# Altium schematic symbol library jlcpcb_2025_04_capacitors_extended_0603.schlib: 3668 symbols (part 20 of 20) (continued)
## TMK107BBJ106MA-T
designator C?  Capacitance: 10uF  (hidden comment: *)
Capacitor, Ceramic (MLCC), 10uF, ±20%, 25V, X5R, ±20%, SMD 0603; Manufacturer: Taiyo Yuden; Manufacturer Part Number: TMK107BBJ106MA-T; Package Size: 0603; JLCPCB Basic Part: No; JLCPCB Part Number: C386081; Supplier 1: LCSC; Category: Capacitors - MLCC; Supplier Part Number 1: C386081; Tolerance: ±20%; Voltage Rating: 25V; Temperature Coefficient: X5R; RoHS: Yes; ComponentLink1Description: Datasheet; ComponentLink1URL: https://wmsc.lcsc.com/wmsc/upload/file/pdf/v2/lcsc/2304140030_Taiyo-Yuden-TMK107BBJ106MA-T_C386081.pdf; ComponentLink2Description: JLCPCB Part URL; ComponentLink2URL: https://jlcpcb.com/partdetail/C386081; ComponentLink3Description: LCSC Part URL; ComponentLink3URL: https://lcsc.com/product-detail/Multilayer-Ceramic-Capacitors-MLCC---SMD-SMT_Taiyo-Yuden-Taiyo-Yuden-TMK107BBJ106MA-T_C386081.html
footprint CAP-0603 (0603 (1608M) Capacitor)
pins: 1, 2

## TMK107BBJ225KAHT
designator C?  Capacitance: 2.2uF  (hidden comment: *)
Capacitor, Ceramic (MLCC), 2.2uF, ±10%, 25V, X5R, ±10%, SMD 0603; Manufacturer: Taiyo Yuden; Manufacturer Part Number: TMK107BBJ225KAHT; Package Size: 0603; JLCPCB Basic Part: No; JLCPCB Part Number: C650980; Supplier 1: LCSC; Category: Capacitors - MLCC; Supplier Part Number 1: C650980; Tolerance: ±10%; Voltage Rating: 25V; Temperature Coefficient: X5R; RoHS: Yes; ComponentLink1Description: Datasheet; ComponentLink1URL: https://wmsc.lcsc.com/wmsc/upload/file/pdf/v2/lcsc/2211282200_Taiyo-Yuden-TMK107BBJ225KAHT_C650980.pdf; ComponentLink2Description: JLCPCB Part URL; ComponentLink2URL: https://jlcpcb.com/partdetail/C650980; ComponentLink3Description: LCSC Part URL; ComponentLink3URL: https://lcsc.com/product-detail/Multilayer-Ceramic-Capacitors-MLCC---SMD-SMT_Taiyo-Yuden-Taiyo-Yuden-TMK107BBJ225KAHT_C650980.html
footprint CAP-0603 (0603 (1608M) Capacitor)
pins: 1, 2

## TMK107BBJ475KA-T
designator C?  Capacitance: 4.7uF  (hidden comment: *)
Capacitor, Ceramic (MLCC), 4.7uF, ±10%, 25V, X5R, ±10%, SMD 0603; Manufacturer: Taiyo Yuden; Manufacturer Part Number: TMK107BBJ475KA-T; Package Size: 0603; JLCPCB Basic Part: No; JLCPCB Part Number: C268021; Supplier 1: LCSC; Category: Capacitors - MLCC; Supplier Part Number 1: C268021; Tolerance: ±10%; Voltage Rating: 25V; Temperature Coefficient: X5R; RoHS: Yes; ComponentLink1Description: Datasheet; ComponentLink1URL: https://wmsc.lcsc.com/wmsc/upload/file/pdf/v2/lcsc/2304140030_Taiyo-Yuden-TMK107BBJ475KA-T_C268021.pdf; ComponentLink2Description: JLCPCB Part URL; ComponentLink2URL: https://jlcpcb.com/partdetail/C268021; ComponentLink3Description: LCSC Part URL; ComponentLink3URL: https://lcsc.com/product-detail/Multilayer-Ceramic-Capacitors-MLCC---SMD-SMT_Taiyo-Yuden-Taiyo-Yuden-TMK107BBJ475KA-T_C268021.html
footprint CAP-0603 (0603 (1608M) Capacitor)
pins: 1, 2

## TMK107BJ105KA-T
designator C?  Capacitance: 1uF  (hidden comment: *)
Capacitor, Ceramic (MLCC), 1uF, ±10%, 25V, X5R, ±10%, SMD 0603; Manufacturer: Taiyo Yuden; Manufacturer Part Number: TMK107BJ105KA-T; Package Size: 0603; JLCPCB Basic Part: No; JLCPCB Part Number: C92828; Supplier 1: LCSC; Category: Capacitors - MLCC; Supplier Part Number 1: C92828; Tolerance: ±10%; Voltage Rating: 25V; Temperature Coefficient: X5R; RoHS: Yes; ComponentLink1Description: Datasheet; ComponentLink1URL: https://wmsc.lcsc.com/wmsc/upload/file/pdf/v2/lcsc/2211282300_Taiyo-Yuden-TMK107BJ105KA-T_C92828.pdf; ComponentLink2Description: JLCPCB Part URL; ComponentLink2URL: https://jlcpcb.com/partdetail/C92828; ComponentLink3Description: LCSC Part URL; ComponentLink3URL: https://lcsc.com/product-detail/Multilayer-Ceramic-Capacitors-MLCC---SMD-SMT_Taiyo-Yuden-Taiyo-Yuden-TMK107BJ105KA-T_C92828.html
footprint CAP-0603 (0603 (1608M) Capacitor)
pins: 1, 2

## TMK107BJ105KAHT
designator C?  Capacitance: 1uF  (hidden comment: *)
Capacitor, Ceramic (MLCC), 1uF, ±10%, 25V, X5R, ±10%, SMD 0603; Manufacturer: Taiyo Yuden; Manufacturer Part Number: TMK107BJ105KAHT; Package Size: 0603; JLCPCB Basic Part: No; JLCPCB Part Number: C650963; Supplier 1: LCSC; Category: Capacitors - MLCC; Supplier Part Number 1: C650963; Tolerance: ±10%; Voltage Rating: 25V; Temperature Coefficient: X5R; RoHS: Yes; ComponentLink1Description: Datasheet; ComponentLink1URL: https://wmsc.lcsc.com/wmsc/upload/file/pdf/v2/lcsc/2304140030_Taiyo-Yuden-TMK107BJ105KAHT_C650963.pdf; ComponentLink2Description: JLCPCB Part URL; ComponentLink2URL: https://jlcpcb.com/partdetail/C650963; ComponentLink3Description: LCSC Part URL; ComponentLink3URL: https://lcsc.com/product-detail/Multilayer-Ceramic-Capacitors-MLCC---SMD-SMT_Taiyo-Yuden-Taiyo-Yuden-TMK107BJ105KAHT_C650963.html
footprint CAP-0603 (0603 (1608M) Capacitor)
pins: 1, 2

## TMK107BJ105MA-T
designator C?  Capacitance: 1uF  (hidden comment: *)
Capacitor, Ceramic (MLCC), 1uF, ±20%, 25V, X5R, ±20%, SMD 0603; Manufacturer: Taiyo Yuden; Manufacturer Part Number: TMK107BJ105MA-T; Package Size: 0603; JLCPCB Basic Part: No; JLCPCB Part Number: C2180229; Supplier 1: LCSC; Category: Capacitors - MLCC; Supplier Part Number 1: C2180229; Tolerance: ±20%; Voltage Rating: 25V; Temperature Coefficient: X5R; RoHS: Yes; ComponentLink1Description: Datasheet; ComponentLink1URL: https://wmsc.lcsc.com/wmsc/upload/file/pdf/v2/lcsc/2211282000_Taiyo-Yuden-TMK107BJ105MA-T_C2180229.pdf; ComponentLink2Description: JLCPCB Part URL; ComponentLink2URL: https://jlcpcb.com/partdetail/C2180229; ComponentLink3Description: LCSC Part URL; ComponentLink3URL: https://lcsc.com/product-detail/Multilayer-Ceramic-Capacitors-MLCC---SMD-SMT_Taiyo-Yuden-Taiyo-Yuden-TMK107BJ105MA-T_C2180229.html
footprint CAP-0603 (0603 (1608M) Capacitor)
pins: 1, 2

## UMF107B7104KAHT
designator C?  Capacitance: 100nF  (hidden comment: *)
Capacitor, Ceramic (MLCC), 100nF, ±10%, 50V, X7R, ±10%, SMD 0603; Manufacturer: Taiyo Yuden; Manufacturer Part Number: UMF107B7104KAHT; Package Size: 0603; JLCPCB Basic Part: No; JLCPCB Part Number: C386106; Supplier 1: LCSC; Category: Capacitors - MLCC; Supplier Part Number 1: C386106; Tolerance: ±10%; Voltage Rating: 50V; Temperature Coefficient: X7R; RoHS: Yes; ComponentLink1Description: Datasheet; ComponentLink1URL: https://wmsc.lcsc.com/wmsc/upload/file/pdf/v2/lcsc/1912111437_Taiyo-Yuden-UMF107B7104KAHT_C386106.pdf; ComponentLink2Description: JLCPCB Part URL; ComponentLink2URL: https://jlcpcb.com/partdetail/C386106; ComponentLink3Description: LCSC Part URL; ComponentLink3URL: https://lcsc.com/product-detail/Multilayer-Ceramic-Capacitors-MLCC---SMD-SMT_Taiyo-Yuden-Taiyo-Yuden-UMF107B7104KAHT_C386106.html
footprint CAP-0603 (0603 (1608M) Capacitor)
pins: 1, 2

## UMJ107BB7103KAHT
designator C?  Capacitance: 10nF  (hidden comment: *)
Capacitor, Ceramic (MLCC), 10nF, ±10%, 50V, X7R, ±10%, SMD 0603; Manufacturer: Taiyo Yuden; Manufacturer Part Number: UMJ107BB7103KAHT; Package Size: 0603; JLCPCB Basic Part: No; JLCPCB Part Number: C651013; Supplier 1: LCSC; Category: Capacitors - MLCC; Supplier Part Number 1: C651013; Tolerance: ±10%; Voltage Rating: 50V; Temperature Coefficient: X7R; RoHS: Yes; ComponentLink1Description: Datasheet; ComponentLink1URL: https://wmsc.lcsc.com/wmsc/upload/file/pdf/v2/lcsc/2304140030_Taiyo-Yuden-UMJ107BB7103KAHT_C651013.pdf; ComponentLink2Description: JLCPCB Part URL; ComponentLink2URL: https://jlcpcb.com/partdetail/C651013; ComponentLink3Description: LCSC Part URL; ComponentLink3URL: https://lcsc.com/product-detail/Multilayer-Ceramic-Capacitors-MLCC---SMD-SMT_Taiyo-Yuden-Taiyo-Yuden-UMJ107BB7103KAHT_C651013.html
footprint CAP-0603 (0603 (1608M) Capacitor)
pins: 1, 2

## UMJ107BB7104KAHT
designator C?  Capacitance: 100nF  (hidden comment: *)
Capacitor, Ceramic (MLCC), 100nF, ±10%, 50V, X7R, ±10%, SMD 0603; Manufacturer: Taiyo Yuden; Manufacturer Part Number: UMJ107BB7104KAHT; Package Size: 0603; JLCPCB Basic Part: No; JLCPCB Part Number: C651002; Supplier 1: LCSC; Category: Capacitors - MLCC; Supplier Part Number 1: C651002; Tolerance: ±10%; Voltage Rating: 50V; Temperature Coefficient: X7R; RoHS: Yes; ComponentLink1Description: Datasheet; ComponentLink1URL: https://wmsc.lcsc.com/wmsc/upload/file/pdf/v2/lcsc/2304140030_Taiyo-Yuden-UMJ107BB7104KAHT_C651002.pdf; ComponentLink2Description: JLCPCB Part URL; ComponentLink2URL: https://jlcpcb.com/partdetail/C651002; ComponentLink3Description: LCSC Part URL; ComponentLink3URL: https://lcsc.com/product-detail/Multilayer-Ceramic-Capacitors-MLCC---SMD-SMT_Taiyo-Yuden-Taiyo-Yuden-UMJ107BB7104KAHT_C651002.html
footprint CAP-0603 (0603 (1608M) Capacitor)
pins: 1, 2

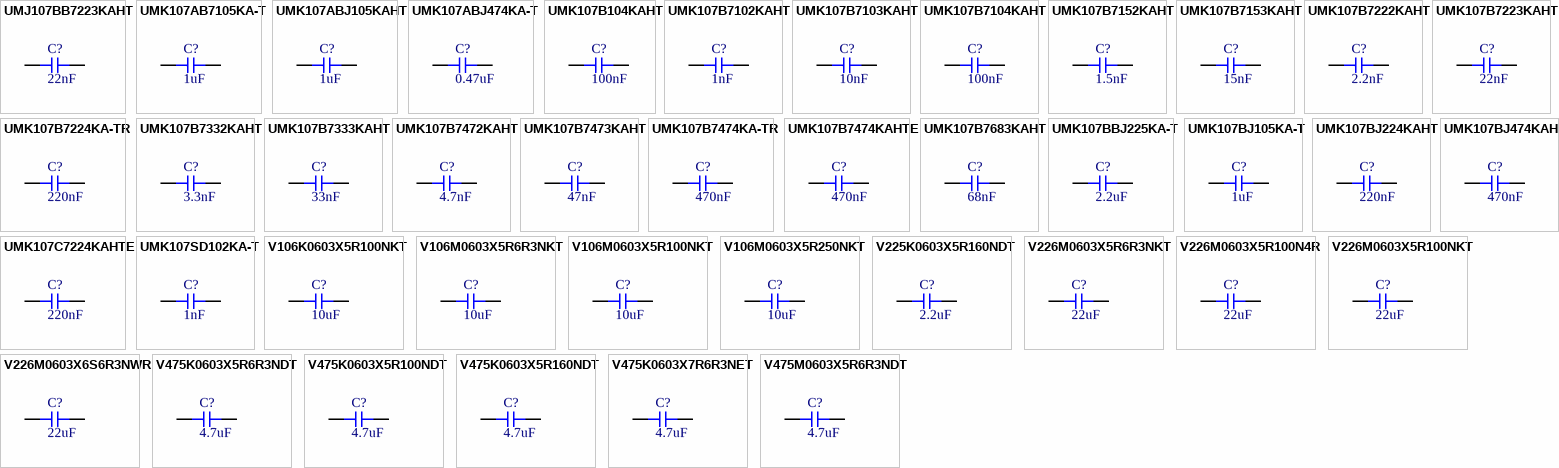
[diagram p90: symbols UMJ107BB7223KAHT to V475M0603X5R6R3NDT]

## UMJ107BB7223KAHT
designator C?  Capacitance: 22nF  (hidden comment: *)
Capacitor, Ceramic (MLCC), 22nF, ±10%, 50V, X7R, ±10%, SMD 0603; Manufacturer: Taiyo Yuden; Manufacturer Part Number: UMJ107BB7223KAHT; Package Size: 0603; JLCPCB Basic Part: No; JLCPCB Part Number: C412616; Supplier 1: LCSC; Category: Capacitors - MLCC; Supplier Part Number 1: C412616; Tolerance: ±10%; Voltage Rating: 50V; Temperature Coefficient: X7R; RoHS: Yes; ComponentLink1Description: Datasheet; ComponentLink1URL: https://wmsc.lcsc.com/wmsc/upload/file/pdf/v2/lcsc/2304140030_Taiyo-Yuden-UMJ107BB7223KAHT_C412616.pdf; ComponentLink2Description: JLCPCB Part URL; ComponentLink2URL: https://jlcpcb.com/partdetail/C412616; ComponentLink3Description: LCSC Part URL; ComponentLink3URL: https://lcsc.com/product-detail/Multilayer-Ceramic-Capacitors-MLCC---SMD-SMT_Taiyo-Yuden-Taiyo-Yuden-UMJ107BB7223KAHT_C412616.html
footprint CAP-0603 (0603 (1608M) Capacitor)
pins: 1, 2

## UMK107AB7105KA-T
designator C?  Capacitance: 1uF  (hidden comment: *)
Capacitor, Ceramic (MLCC), 1uF, ±10%, 50V, X7R, ±10%, SMD 0603; Manufacturer: Taiyo Yuden; Manufacturer Part Number: UMK107AB7105KA-T; Package Size: 0603; JLCPCB Basic Part: No; JLCPCB Part Number: C105174; Supplier 1: LCSC; Category: Capacitors - MLCC; Supplier Part Number 1: C105174; Tolerance: ±10%; Voltage Rating: 50V; Temperature Coefficient: X7R; RoHS: Yes; ComponentLink1Description: Datasheet; ComponentLink1URL: https://wmsc.lcsc.com/wmsc/upload/file/pdf/v2/lcsc/2211282300_Taiyo-Yuden-UMK107AB7105KA-T_C105174.pdf; ComponentLink2Description: JLCPCB Part URL; ComponentLink2URL: https://jlcpcb.com/partdetail/C105174; ComponentLink3Description: LCSC Part URL; ComponentLink3URL: https://lcsc.com/product-detail/Multilayer-Ceramic-Capacitors-MLCC---SMD-SMT_Taiyo-Yuden-Taiyo-Yuden-UMK107AB7105KA-T_C105174.html
footprint CAP-0603 (0603 (1608M) Capacitor)
pins: 1, 2

## UMK107ABJ105KAHT
designator C?  Capacitance: 1uF  (hidden comment: *)
Capacitor, Ceramic (MLCC), 1uF, ±10%, 50V, X5R, ±10%, SMD 0603; Manufacturer: Taiyo Yuden; Manufacturer Part Number: UMK107ABJ105KAHT; Package Size: 0603; JLCPCB Basic Part: No; JLCPCB Part Number: C386149; Supplier 1: LCSC; Category: Capacitors - MLCC; Supplier Part Number 1: C386149; Tolerance: ±10%; Voltage Rating: 50V; Temperature Coefficient: X5R; RoHS: Yes; ComponentLink1Description: Datasheet; ComponentLink1URL: https://wmsc.lcsc.com/wmsc/upload/file/pdf/v2/lcsc/2211282230_Taiyo-Yuden-UMK107ABJ105KAHT_C386149.pdf; ComponentLink2Description: JLCPCB Part URL; ComponentLink2URL: https://jlcpcb.com/partdetail/C386149; ComponentLink3Description: LCSC Part URL; ComponentLink3URL: https://lcsc.com/product-detail/Multilayer-Ceramic-Capacitors-MLCC---SMD-SMT_Taiyo-Yuden-Taiyo-Yuden-UMK107ABJ105KAHT_C386149.html
footprint CAP-0603 (0603 (1608M) Capacitor)
pins: 1, 2

## UMK107ABJ474KA-T
designator C?  Capacitance: 0.47uF  (hidden comment: *)
Capacitor, Ceramic (MLCC), 0.47uF, ±10%, 50V, X5R, ±10%, SMD 0603; Manufacturer: Taiyo Yuden; Manufacturer Part Number: UMK107ABJ474KA-T; Package Size: 0603; JLCPCB Basic Part: No; JLCPCB Part Number: C386150; Supplier 1: LCSC; Category: Capacitors - MLCC; Supplier Part Number 1: C386150; Tolerance: ±10%; Voltage Rating: 50V; Temperature Coefficient: X5R; RoHS: Yes; ComponentLink1Description: Datasheet; ComponentLink1URL: https://wmsc.lcsc.com/wmsc/upload/file/pdf/v2/lcsc/2211282230_Taiyo-Yuden-UMK107ABJ474KA-T_C386150.pdf; ComponentLink2Description: JLCPCB Part URL; ComponentLink2URL: https://jlcpcb.com/partdetail/C386150; ComponentLink3Description: LCSC Part URL; ComponentLink3URL: https://lcsc.com/product-detail/Multilayer-Ceramic-Capacitors-MLCC---SMD-SMT_Taiyo-Yuden-Taiyo-Yuden-UMK107ABJ474KA-T_C386150.html
footprint CAP-0603 (0603 (1608M) Capacitor)
pins: 1, 2

## UMK107B104KAHT
designator C?  Capacitance: 100nF  (hidden comment: *)
Capacitor, Ceramic (MLCC), 100nF, ±10%, 50V, X5R, ±10%, SMD 0603; Manufacturer: Taiyo Yuden; Manufacturer Part Number: UMK107B104KAHT; Package Size: 0603; JLCPCB Basic Part: No; JLCPCB Part Number: C386152; Supplier 1: LCSC; Category: Capacitors - MLCC; Supplier Part Number 1: C386152; Tolerance: ±10%; Voltage Rating: 50V; Temperature Coefficient: X5R; RoHS: Yes; ComponentLink1Description: Datasheet; ComponentLink1URL: https://wmsc.lcsc.com/wmsc/upload/file/pdf/v2/lcsc/2304140030_Taiyo-Yuden-UMK107B104KAHT_C386152.pdf; ComponentLink2Description: JLCPCB Part URL; ComponentLink2URL: https://jlcpcb.com/partdetail/C386152; ComponentLink3Description: LCSC Part URL; ComponentLink3URL: https://lcsc.com/product-detail/Multilayer-Ceramic-Capacitors-MLCC---SMD-SMT_Taiyo-Yuden-Taiyo-Yuden-UMK107B104KAHT_C386152.html
footprint CAP-0603 (0603 (1608M) Capacitor)
pins: 1, 2

## UMK107B7102KAHT
designator C?  Capacitance: 1nF  (hidden comment: *)
Capacitor, Ceramic (MLCC), 1nF, ±10%, 50V, X7R, ±10%, SMD 0603; Manufacturer: Taiyo Yuden; Manufacturer Part Number: UMK107B7102KAHT; Package Size: 0603; JLCPCB Basic Part: No; JLCPCB Part Number: C650959; Supplier 1: LCSC; Category: Capacitors - MLCC; Supplier Part Number 1: C650959; Tolerance: ±10%; Voltage Rating: 50V; Temperature Coefficient: X7R; RoHS: Yes; ComponentLink1Description: Datasheet; ComponentLink1URL: https://wmsc.lcsc.com/wmsc/upload/file/pdf/v2/lcsc/2304140030_Taiyo-Yuden-UMK107B7102KAHT_C650959.pdf; ComponentLink2Description: JLCPCB Part URL; ComponentLink2URL: https://jlcpcb.com/partdetail/C650959; ComponentLink3Description: LCSC Part URL; ComponentLink3URL: https://lcsc.com/product-detail/Multilayer-Ceramic-Capacitors-MLCC---SMD-SMT_Taiyo-Yuden-Taiyo-Yuden-UMK107B7102KAHT_C650959.html
footprint CAP-0603 (0603 (1608M) Capacitor)
pins: 1, 2

## UMK107B7103KAHT
designator C?  Capacitance: 10nF  (hidden comment: *)
Capacitor, Ceramic (MLCC), 10nF, ±10%, 50V, X7R, ±10%, SMD 0603; Manufacturer: Taiyo Yuden; Manufacturer Part Number: UMK107B7103KAHT; Package Size: 0603; JLCPCB Basic Part: No; JLCPCB Part Number: C386154; Supplier 1: LCSC; Category: Capacitors - MLCC; Supplier Part Number 1: C386154; Tolerance: ±10%; Voltage Rating: 50V; Temperature Coefficient: X7R; RoHS: Yes; ComponentLink1Description: Datasheet; ComponentLink1URL: https://wmsc.lcsc.com/wmsc/upload/file/pdf/v2/lcsc/2304140030_Taiyo-Yuden-UMK107B7103KAHT_C386154.pdf; ComponentLink2Description: JLCPCB Part URL; ComponentLink2URL: https://jlcpcb.com/partdetail/C386154; ComponentLink3Description: LCSC Part URL; ComponentLink3URL: https://lcsc.com/product-detail/Multilayer-Ceramic-Capacitors-MLCC---SMD-SMT_Taiyo-Yuden-Taiyo-Yuden-UMK107B7103KAHT_C386154.html
footprint CAP-0603 (0603 (1608M) Capacitor)
pins: 1, 2

## UMK107B7104KAHT
designator C?  Capacitance: 100nF  (hidden comment: *)
Capacitor, Ceramic (MLCC), 100nF, ±10%, 50V, X7R, ±10%, SMD 0603; Manufacturer: Taiyo Yuden; Manufacturer Part Number: UMK107B7104KAHT; Package Size: 0603; JLCPCB Basic Part: No; JLCPCB Part Number: C386155; Supplier 1: LCSC; Category: Capacitors - MLCC; Supplier Part Number 1: C386155; Tolerance: ±10%; Voltage Rating: 50V; Temperature Coefficient: X7R; RoHS: Yes; ComponentLink1Description: Datasheet; ComponentLink1URL: https://wmsc.lcsc.com/wmsc/upload/file/pdf/v2/lcsc/1912111437_Taiyo-Yuden-UMK107B7104KAHT_C386155.pdf; ComponentLink2Description: JLCPCB Part URL; ComponentLink2URL: https://jlcpcb.com/partdetail/C386155; ComponentLink3Description: LCSC Part URL; ComponentLink3URL: https://lcsc.com/product-detail/Multilayer-Ceramic-Capacitors-MLCC---SMD-SMT_Taiyo-Yuden-Taiyo-Yuden-UMK107B7104KAHT_C386155.html
footprint CAP-0603 (0603 (1608M) Capacitor)
pins: 1, 2

## UMK107B7152KAHT
designator C?  Capacitance: 1.5nF  (hidden comment: *)
Capacitor, Ceramic (MLCC), 1.5nF, ±10%, 50V, X7R, ±10%, SMD 0603; Manufacturer: Taiyo Yuden; Manufacturer Part Number: UMK107B7152KAHT; Package Size: 0603; JLCPCB Basic Part: No; JLCPCB Part Number: C841048; Supplier 1: LCSC; Category: Capacitors - MLCC; Supplier Part Number 1: C841048; Tolerance: ±10%; Voltage Rating: 50V; Temperature Coefficient: X7R; RoHS: Yes; ComponentLink1Description: Datasheet; ComponentLink1URL: https://wmsc.lcsc.com/wmsc/upload/file/pdf/v2/lcsc/2211282200_Taiyo-Yuden-UMK107B7152KAHT_C841048.pdf; ComponentLink2Description: JLCPCB Part URL; ComponentLink2URL: https://jlcpcb.com/partdetail/C841048; ComponentLink3Description: LCSC Part URL; ComponentLink3URL: https://lcsc.com/product-detail/Multilayer-Ceramic-Capacitors-MLCC---SMD-SMT_Taiyo-Yuden-Taiyo-Yuden-UMK107B7152KAHT_C841048.html
footprint CAP-0603 (0603 (1608M) Capacitor)
pins: 1, 2

## UMK107B7153KAHT
designator C?  Capacitance: 15nF  (hidden comment: *)
Capacitor, Ceramic (MLCC), 15nF, ±10%, 50V, X7R, ±10%, SMD 0603; Manufacturer: Taiyo Yuden; Manufacturer Part Number: UMK107B7153KAHT; Package Size: 0603; JLCPCB Basic Part: No; JLCPCB Part Number: C386156; Supplier 1: LCSC; Category: Capacitors - MLCC; Supplier Part Number 1: C386156; Tolerance: ±10%; Voltage Rating: 50V; Temperature Coefficient: X7R; RoHS: Yes; ComponentLink1Description: Datasheet; ComponentLink1URL: https://wmsc.lcsc.com/wmsc/upload/file/pdf/v2/lcsc/2304140030_Taiyo-Yuden-UMK107B7153KAHT_C386156.pdf; ComponentLink2Description: JLCPCB Part URL; ComponentLink2URL: https://jlcpcb.com/partdetail/C386156; ComponentLink3Description: LCSC Part URL; ComponentLink3URL: https://lcsc.com/product-detail/Multilayer-Ceramic-Capacitors-MLCC---SMD-SMT_Taiyo-Yuden-Taiyo-Yuden-UMK107B7153KAHT_C386156.html
footprint CAP-0603 (0603 (1608M) Capacitor)
pins: 1, 2

## UMK107B7222KAHT
designator C?  Capacitance: 2.2nF  (hidden comment: *)
Capacitor, Ceramic (MLCC), 2.2nF, ±10%, 50V, X7R, ±10%, SMD 0603; Manufacturer: Taiyo Yuden; Manufacturer Part Number: UMK107B7222KAHT; Package Size: 0603; JLCPCB Basic Part: No; JLCPCB Part Number: C650979; Supplier 1: LCSC; Category: Capacitors - MLCC; Supplier Part Number 1: C650979; Tolerance: ±10%; Voltage Rating: 50V; Temperature Coefficient: X7R; RoHS: Yes; ComponentLink1Description: Datasheet; ComponentLink1URL: https://wmsc.lcsc.com/wmsc/upload/file/pdf/v2/lcsc/2304140030_Taiyo-Yuden-UMK107B7222KAHT_C650979.pdf; ComponentLink2Description: JLCPCB Part URL; ComponentLink2URL: https://jlcpcb.com/partdetail/C650979; ComponentLink3Description: LCSC Part URL; ComponentLink3URL: https://lcsc.com/product-detail/Multilayer-Ceramic-Capacitors-MLCC---SMD-SMT_Taiyo-Yuden-Taiyo-Yuden-UMK107B7222KAHT_C650979.html
footprint CAP-0603 (0603 (1608M) Capacitor)
pins: 1, 2

## UMK107B7223KAHT
designator C?  Capacitance: 22nF  (hidden comment: *)
Capacitor, Ceramic (MLCC), 22nF, ±10%, 50V, X7R, ±10%, SMD 0603; Manufacturer: Taiyo Yuden; Manufacturer Part Number: UMK107B7223KAHT; Package Size: 0603; JLCPCB Basic Part: No; JLCPCB Part Number: C650951; Supplier 1: LCSC; Category: Capacitors - MLCC; Supplier Part Number 1: C650951; Tolerance: ±10%; Voltage Rating: 50V; Temperature Coefficient: X7R; RoHS: Yes; ComponentLink1Description: Datasheet; ComponentLink1URL: https://wmsc.lcsc.com/wmsc/upload/file/pdf/v2/lcsc/2304140030_Taiyo-Yuden-UMK107B7223KAHT_C650951.pdf; ComponentLink2Description: JLCPCB Part URL; ComponentLink2URL: https://jlcpcb.com/partdetail/C650951; ComponentLink3Description: LCSC Part URL; ComponentLink3URL: https://lcsc.com/product-detail/Multilayer-Ceramic-Capacitors-MLCC---SMD-SMT_Taiyo-Yuden-Taiyo-Yuden-UMK107B7223KAHT_C650951.html
footprint CAP-0603 (0603 (1608M) Capacitor)
pins: 1, 2

## UMK107B7224KA-TR
designator C?  Capacitance: 220nF  (hidden comment: *)
Capacitor, Ceramic (MLCC), 220nF, ±10%, 50V, X7R, ±10%, SMD 0603; Manufacturer: Taiyo Yuden; Manufacturer Part Number: UMK107B7224KA-TR; Package Size: 0603; JLCPCB Basic Part: No; JLCPCB Part Number: C524964; Supplier 1: LCSC; Category: Capacitors - MLCC; Supplier Part Number 1: C524964; Tolerance: ±10%; Voltage Rating: 50V; Temperature Coefficient: X7R; RoHS: Yes; ComponentLink1Description: Datasheet; ComponentLink1URL: https://wmsc.lcsc.com/wmsc/upload/file/pdf/v2/lcsc/2211282200_Taiyo-Yuden-UMK107B7224KA-TR_C524964.pdf; ComponentLink2Description: JLCPCB Part URL; ComponentLink2URL: https://jlcpcb.com/partdetail/C524964; ComponentLink3Description: LCSC Part URL; ComponentLink3URL: https://lcsc.com/product-detail/Multilayer-Ceramic-Capacitors-MLCC---SMD-SMT_Taiyo-Yuden-Taiyo-Yuden-UMK107B7224KA-TR_C524964.html
footprint CAP-0603 (0603 (1608M) Capacitor)
pins: 1, 2

## UMK107B7332KAHT
designator C?  Capacitance: 3.3nF  (hidden comment: *)
Capacitor, Ceramic (MLCC), 3.3nF, ±10%, 50V, X7R, ±10%, SMD 0603; Manufacturer: Taiyo Yuden; Manufacturer Part Number: UMK107B7332KAHT; Package Size: 0603; JLCPCB Basic Part: No; JLCPCB Part Number: C650966; Supplier 1: LCSC; Category: Capacitors - MLCC; Supplier Part Number 1: C650966; Tolerance: ±10%; Voltage Rating: 50V; Temperature Coefficient: X7R; RoHS: Yes; ComponentLink1Description: Datasheet; ComponentLink1URL: https://wmsc.lcsc.com/wmsc/upload/file/pdf/v2/lcsc/2304140030_Taiyo-Yuden-UMK107B7332KAHT_C650966.pdf; ComponentLink2Description: JLCPCB Part URL; ComponentLink2URL: https://jlcpcb.com/partdetail/C650966; ComponentLink3Description: LCSC Part URL; ComponentLink3URL: https://lcsc.com/product-detail/Multilayer-Ceramic-Capacitors-MLCC---SMD-SMT_Taiyo-Yuden-Taiyo-Yuden-UMK107B7332KAHT_C650966.html
footprint CAP-0603 (0603 (1608M) Capacitor)
pins: 1, 2

## UMK107B7333KAHT
designator C?  Capacitance: 33nF  (hidden comment: *)
Capacitor, Ceramic (MLCC), 33nF, ±10%, 50V, X7R, ±10%, SMD 0603; Manufacturer: Taiyo Yuden; Manufacturer Part Number: UMK107B7333KAHT; Package Size: 0603; JLCPCB Basic Part: No; JLCPCB Part Number: C650993; Supplier 1: LCSC; Category: Capacitors - MLCC; Supplier Part Number 1: C650993; Tolerance: ±10%; Voltage Rating: 50V; Temperature Coefficient: X7R; RoHS: Yes; ComponentLink1Description: Datasheet; ComponentLink1URL: https://wmsc.lcsc.com/wmsc/upload/file/pdf/v2/lcsc/2304140030_Taiyo-Yuden-UMK107B7333KAHT_C650993.pdf; ComponentLink2Description: JLCPCB Part URL; ComponentLink2URL: https://jlcpcb.com/partdetail/C650993; ComponentLink3Description: LCSC Part URL; ComponentLink3URL: https://lcsc.com/product-detail/Multilayer-Ceramic-Capacitors-MLCC---SMD-SMT_Taiyo-Yuden-Taiyo-Yuden-UMK107B7333KAHT_C650993.html
footprint CAP-0603 (0603 (1608M) Capacitor)
pins: 1, 2

## UMK107B7472KAHT
designator C?  Capacitance: 4.7nF  (hidden comment: *)
Capacitor, Ceramic (MLCC), 4.7nF, ±10%, 50V, X7R, ±10%, SMD 0603; Manufacturer: Taiyo Yuden; Manufacturer Part Number: UMK107B7472KAHT; Package Size: 0603; JLCPCB Basic Part: No; JLCPCB Part Number: C386157; Supplier 1: LCSC; Category: Capacitors - MLCC; Supplier Part Number 1: C386157; Tolerance: ±10%; Voltage Rating: 50V; Temperature Coefficient: X7R; RoHS: Yes; ComponentLink1Description: Datasheet; ComponentLink1URL: https://wmsc.lcsc.com/wmsc/upload/file/pdf/v2/lcsc/2304140030_Taiyo-Yuden-UMK107B7472KAHT_C386157.pdf; ComponentLink2Description: JLCPCB Part URL; ComponentLink2URL: https://jlcpcb.com/partdetail/C386157; ComponentLink3Description: LCSC Part URL; ComponentLink3URL: https://lcsc.com/product-detail/Multilayer-Ceramic-Capacitors-MLCC---SMD-SMT_Taiyo-Yuden-Taiyo-Yuden-UMK107B7472KAHT_C386157.html
footprint CAP-0603 (0603 (1608M) Capacitor)
pins: 1, 2

## UMK107B7473KAHT
designator C?  Capacitance: 47nF  (hidden comment: *)
Capacitor, Ceramic (MLCC), 47nF, ±10%, 50V, X7R, ±10%, SMD 0603; Manufacturer: Taiyo Yuden; Manufacturer Part Number: UMK107B7473KAHT; Package Size: 0603; JLCPCB Basic Part: No; JLCPCB Part Number: C386158; Supplier 1: LCSC; Category: Capacitors - MLCC; Supplier Part Number 1: C386158; Tolerance: ±10%; Voltage Rating: 50V; Temperature Coefficient: X7R; RoHS: Yes; ComponentLink1Description: Datasheet; ComponentLink1URL: https://wmsc.lcsc.com/wmsc/upload/file/pdf/v2/lcsc/2304140030_Taiyo-Yuden-UMK107B7473KAHT_C386158.pdf; ComponentLink2Description: JLCPCB Part URL; ComponentLink2URL: https://jlcpcb.com/partdetail/C386158; ComponentLink3Description: LCSC Part URL; ComponentLink3URL: https://lcsc.com/product-detail/Multilayer-Ceramic-Capacitors-MLCC---SMD-SMT_Taiyo-Yuden-Taiyo-Yuden-UMK107B7473KAHT_C386158.html
footprint CAP-0603 (0603 (1608M) Capacitor)
pins: 1, 2

## UMK107B7474KA-TR
designator C?  Capacitance: 470nF  (hidden comment: *)
Capacitor, Ceramic (MLCC), 470nF, ±10%, 50V, X7R, ±10%, SMD 0603; Manufacturer: Taiyo Yuden; Manufacturer Part Number: UMK107B7474KA-TR; Package Size: 0603; JLCPCB Basic Part: No; JLCPCB Part Number: C92847; Supplier 1: LCSC; Category: Capacitors - MLCC; Supplier Part Number 1: C92847; Tolerance: ±10%; Voltage Rating: 50V; Temperature Coefficient: X7R; RoHS: Yes; ComponentLink1Description: Datasheet; ComponentLink1URL: https://wmsc.lcsc.com/wmsc/upload/file/pdf/v2/lcsc/2211282300_Taiyo-Yuden-UMK107B7474KA-TR_C92847.pdf; ComponentLink2Description: JLCPCB Part URL; ComponentLink2URL: https://jlcpcb.com/partdetail/C92847; ComponentLink3Description: LCSC Part URL; ComponentLink3URL: https://lcsc.com/product-detail/Multilayer-Ceramic-Capacitors-MLCC---SMD-SMT_Taiyo-Yuden-Taiyo-Yuden-UMK107B7474KA-TR_C92847.html
footprint CAP-0603 (0603 (1608M) Capacitor)
pins: 1, 2

## UMK107B7474KAHTE
designator C?  Capacitance: 470nF  (hidden comment: *)
Capacitor, Ceramic (MLCC), 470nF, ±10%, 50V, X7R, ±10%, SMD 0603; Manufacturer: Taiyo Yuden; Manufacturer Part Number: UMK107B7474KAHTE; Package Size: 0603; JLCPCB Basic Part: No; JLCPCB Part Number: C2905413; Supplier 1: LCSC; Category: Capacitors - MLCC; Supplier Part Number 1: C2905413; Tolerance: ±10%; Voltage Rating: 50V; Temperature Coefficient: X7R; RoHS: Yes; ComponentLink1Description: Datasheet; ComponentLink1URL: https://wmsc.lcsc.com/wmsc/upload/file/pdf/v2/lcsc/2203231830_Taiyo-Yuden-UMK107B7474KAHTE_C2905413.pdf; ComponentLink2Description: JLCPCB Part URL; ComponentLink2URL: https://jlcpcb.com/partdetail/C2905413; ComponentLink3Description: LCSC Part URL; ComponentLink3URL: https://lcsc.com/product-detail/Multilayer-Ceramic-Capacitors-MLCC---SMD-SMT_Taiyo-Yuden-Taiyo-Yuden-UMK107B7474KAHTE_C2905413.html
footprint CAP-0603 (0603 (1608M) Capacitor)
pins: 1, 2

## UMK107B7683KAHT
designator C?  Capacitance: 68nF  (hidden comment: *)
Capacitor, Ceramic (MLCC), 68nF, ±10%, 50V, X7R, ±10%, SMD 0603; Manufacturer: Taiyo Yuden; Manufacturer Part Number: UMK107B7683KAHT; Package Size: 0603; JLCPCB Basic Part: No; JLCPCB Part Number: C650957; Supplier 1: LCSC; Category: Capacitors - MLCC; Supplier Part Number 1: C650957; Tolerance: ±10%; Voltage Rating: 50V; Temperature Coefficient: X7R; RoHS: Yes; ComponentLink1Description: Datasheet; ComponentLink1URL: https://wmsc.lcsc.com/wmsc/upload/file/pdf/v2/lcsc/2304140030_Taiyo-Yuden-UMK107B7683KAHT_C650957.pdf; ComponentLink2Description: JLCPCB Part URL; ComponentLink2URL: https://jlcpcb.com/partdetail/C650957; ComponentLink3Description: LCSC Part URL; ComponentLink3URL: https://lcsc.com/product-detail/Multilayer-Ceramic-Capacitors-MLCC---SMD-SMT_Taiyo-Yuden-Taiyo-Yuden-UMK107B7683KAHT_C650957.html
footprint CAP-0603 (0603 (1608M) Capacitor)
pins: 1, 2

## UMK107BBJ225KA-T
designator C?  Capacitance: 2.2uF  (hidden comment: *)
Capacitor, Ceramic (MLCC), 2.2uF, ±10%, 50V, X5R, ±10%, SMD 0603; Manufacturer: Taiyo Yuden; Manufacturer Part Number: UMK107BBJ225KA-T; Package Size: 0603; JLCPCB Basic Part: No; JLCPCB Part Number: C268016; Supplier 1: LCSC; Category: Capacitors - MLCC; Supplier Part Number 1: C268016; Tolerance: ±10%; Voltage Rating: 50V; Temperature Coefficient: X5R; RoHS: Yes; ComponentLink1Description: Datasheet; ComponentLink1URL: https://wmsc.lcsc.com/wmsc/upload/file/pdf/v2/lcsc/2211282230_Taiyo-Yuden-UMK107BBJ225KA-T_C268016.pdf; ComponentLink2Description: JLCPCB Part URL; ComponentLink2URL: https://jlcpcb.com/partdetail/C268016; ComponentLink3Description: LCSC Part URL; ComponentLink3URL: https://lcsc.com/product-detail/Multilayer-Ceramic-Capacitors-MLCC---SMD-SMT_Taiyo-Yuden-Taiyo-Yuden-UMK107BBJ225KA-T_C268016.html
footprint CAP-0603 (0603 (1608M) Capacitor)
pins: 1, 2

## UMK107BJ105KA-T
designator C?  Capacitance: 1uF  (hidden comment: *)
Capacitor, Ceramic (MLCC), 1uF, ±10%, 50V, X5R, ±10%, SMD 0603; Manufacturer: Taiyo Yuden; Manufacturer Part Number: UMK107BJ105KA-T; Package Size: 0603; JLCPCB Basic Part: No; JLCPCB Part Number: C92848; Supplier 1: LCSC; Category: Capacitors - MLCC; Supplier Part Number 1: C92848; Tolerance: ±10%; Voltage Rating: 50V; Temperature Coefficient: X5R; RoHS: Yes; ComponentLink1Description: Datasheet; ComponentLink1URL: https://wmsc.lcsc.com/wmsc/upload/file/pdf/v2/lcsc/2405161633_Taiyo-Yuden-UMK107BJ105KA-T_C92848.pdf; ComponentLink2Description: JLCPCB Part URL; ComponentLink2URL: https://jlcpcb.com/partdetail/C92848; ComponentLink3Description: LCSC Part URL; ComponentLink3URL: https://lcsc.com/product-detail/Multilayer-Ceramic-Capacitors-MLCC---SMD-SMT_Taiyo-Yuden-Taiyo-Yuden-UMK107BJ105KA-T_C92848.html
footprint CAP-0603 (0603 (1608M) Capacitor)
pins: 1, 2

## UMK107BJ224KAHT
designator C?  Capacitance: 220nF  (hidden comment: *)
Capacitor, Ceramic (MLCC), 220nF, ±10%, 50V, X5R, ±10%, SMD 0603; Manufacturer: Taiyo Yuden; Manufacturer Part Number: UMK107BJ224KAHT; Package Size: 0603; JLCPCB Basic Part: No; JLCPCB Part Number: C650978; Supplier 1: LCSC; Category: Capacitors - MLCC; Supplier Part Number 1: C650978; Tolerance: ±10%; Voltage Rating: 50V; Temperature Coefficient: X5R; RoHS: Yes; ComponentLink1Description: Datasheet; ComponentLink1URL: https://wmsc.lcsc.com/wmsc/upload/file/pdf/v2/lcsc/2304140030_Taiyo-Yuden-UMK107BJ224KAHT_C650978.pdf; ComponentLink2Description: JLCPCB Part URL; ComponentLink2URL: https://jlcpcb.com/partdetail/C650978; ComponentLink3Description: LCSC Part URL; ComponentLink3URL: https://lcsc.com/product-detail/Multilayer-Ceramic-Capacitors-MLCC---SMD-SMT_Taiyo-Yuden-Taiyo-Yuden-UMK107BJ224KAHT_C650978.html
footprint CAP-0603 (0603 (1608M) Capacitor)
pins: 1, 2

## UMK107BJ474KAHT
designator C?  Capacitance: 470nF  (hidden comment: *)
Capacitor, Ceramic (MLCC), 470nF, ±10%, 50V, X5R, ±10%, SMD 0603; Manufacturer: Taiyo Yuden; Manufacturer Part Number: UMK107BJ474KAHT; Package Size: 0603; JLCPCB Basic Part: No; JLCPCB Part Number: C651022; Supplier 1: LCSC; Category: Capacitors - MLCC; Supplier Part Number 1: C651022; Tolerance: ±10%; Voltage Rating: 50V; Temperature Coefficient: X5R; RoHS: Yes; ComponentLink1Description: Datasheet; ComponentLink1URL: https://wmsc.lcsc.com/wmsc/upload/file/pdf/v2/lcsc/2304140030_Taiyo-Yuden-UMK107BJ474KAHT_C651022.pdf; ComponentLink2Description: JLCPCB Part URL; ComponentLink2URL: https://jlcpcb.com/partdetail/C651022; ComponentLink3Description: LCSC Part URL; ComponentLink3URL: https://lcsc.com/product-detail/Multilayer-Ceramic-Capacitors-MLCC---SMD-SMT_Taiyo-Yuden-Taiyo-Yuden-UMK107BJ474KAHT_C651022.html
footprint CAP-0603 (0603 (1608M) Capacitor)
pins: 1, 2

## UMK107C7224KAHTE
designator C?  Capacitance: 220nF  (hidden comment: *)
Capacitor, Ceramic (MLCC), 220nF, ±10%, 50V, X7S, ±10%, SMD 0603; Manufacturer: Taiyo Yuden; Manufacturer Part Number: UMK107C7224KAHTE; Package Size: 0603; JLCPCB Basic Part: No; JLCPCB Part Number: C386159; Supplier 1: LCSC; Category: Capacitors - MLCC; Supplier Part Number 1: C386159; Tolerance: ±10%; Voltage Rating: 50V; Temperature Coefficient: X7S; RoHS: Yes; ComponentLink1Description: Datasheet; ComponentLink1URL: https://wmsc.lcsc.com/wmsc/upload/file/pdf/v2/lcsc/2304140030_Taiyo-Yuden-UMK107C7224KAHTE_C386159.pdf; ComponentLink2Description: JLCPCB Part URL; ComponentLink2URL: https://jlcpcb.com/partdetail/C386159; ComponentLink3Description: LCSC Part URL; ComponentLink3URL: https://lcsc.com/product-detail/Multilayer-Ceramic-Capacitors-MLCC---SMD-SMT_Taiyo-Yuden-Taiyo-Yuden-UMK107C7224KAHTE_C386159.html
footprint CAP-0603 (0603 (1608M) Capacitor)
pins: 1, 2

## UMK107SD102KA-T
designator C?  Capacitance: 1nF  (hidden comment: *)
Capacitor, Ceramic (MLCC), 1nF, ±10%, 50V, ±10%, SMD 0603; Manufacturer: Taiyo Yuden; Manufacturer Part Number: UMK107SD102KA-T; Package Size: 0603; JLCPCB Basic Part: No; JLCPCB Part Number: C524965; Supplier 1: LCSC; Category: Capacitors - MLCC; Supplier Part Number 1: C524965; Tolerance: ±10%; Voltage Rating: 50V; RoHS: Yes; ComponentLink1Description: Datasheet; ComponentLink1URL: https://wmsc.lcsc.com/wmsc/upload/file/pdf/v2/lcsc/2211282200_Taiyo-Yuden-UMK107SD102KA-T_C524965.pdf; ComponentLink2Description: JLCPCB Part URL; ComponentLink2URL: https://jlcpcb.com/partdetail/C524965; ComponentLink3Description: LCSC Part URL; ComponentLink3URL: https://lcsc.com/product-detail/Multilayer-Ceramic-Capacitors-MLCC---SMD-SMT_Taiyo-Yuden-Taiyo-Yuden-UMK107SD102KA-T_C524965.html
footprint CAP-0603 (0603 (1608M) Capacitor)
pins: 1, 2

## V106K0603X5R100NKT
designator C?  Capacitance: 10uF  (hidden comment: *)
Capacitor, Ceramic (MLCC), 10uF, 10V, X5R, SMD 0603; Manufacturer: VIIYONG; Manufacturer Part Number: V106K0603X5R100NKT; Package Size: 0603; JLCPCB Basic Part: No; JLCPCB Part Number: C2980388; Supplier 1: LCSC; Category: Capacitors - MLCC; Supplier Part Number 1: C2980388; Voltage Rating: 10V; Temperature Coefficient: X5R; RoHS: Yes; ComponentLink1Description: Datasheet; ComponentLink1URL: https://wmsc.lcsc.com/wmsc/upload/file/pdf/v2/lcsc/2203041530_VIIYONG-V106K0603X5R100NKT_C2980388.pdf; ComponentLink2Description: JLCPCB Part URL; ComponentLink2URL: https://jlcpcb.com/partdetail/C2980388; ComponentLink3Description: LCSC Part URL; ComponentLink3URL: https://lcsc.com/product-detail/Multilayer-Ceramic-Capacitors-MLCC---SMD-SMT_VIIYONG-VIIYONG-V106K0603X5R100NKT_C2980388.html
footprint CAP-0603 (0603 (1608M) Capacitor)
pins: 1, 2

## V106M0603X5R6R3NKT
designator C?  Capacitance: 10uF  (hidden comment: *)
Capacitor, Ceramic (MLCC), 10uF, ±20%, 6.3V, X5R, ±20%, SMD 0603; Manufacturer: VIIYONG; Manufacturer Part Number: V106M0603X5R6R3NKT; Package Size: 0603; JLCPCB Basic Part: No; JLCPCB Part Number: C2980391; Supplier 1: LCSC; Category: Capacitors - MLCC; Supplier Part Number 1: C2980391; Tolerance: ±20%; Voltage Rating: 6.3V; Temperature Coefficient: X5R; RoHS: Yes; ComponentLink1Description: Datasheet; ComponentLink1URL: https://wmsc.lcsc.com/wmsc/upload/file/pdf/v2/lcsc/2203041530_VIIYONG-V106M0603X5R6R3NKT_C2980391.pdf; ComponentLink2Description: JLCPCB Part URL; ComponentLink2URL: https://jlcpcb.com/partdetail/C2980391; ComponentLink3Description: LCSC Part URL; ComponentLink3URL: https://lcsc.com/product-detail/Multilayer-Ceramic-Capacitors-MLCC---SMD-SMT_VIIYONG-VIIYONG-V106M0603X5R6R3NKT_C2980391.html
footprint CAP-0603 (0603 (1608M) Capacitor)
pins: 1, 2

## V106M0603X5R100NKT
designator C?  Capacitance: 10uF  (hidden comment: *)
Capacitor, Ceramic (MLCC), 10uF, 10V, X5R, SMD 0603; Manufacturer: VIIYONG; Manufacturer Part Number: V106M0603X5R100NKT; Package Size: 0603; JLCPCB Basic Part: No; JLCPCB Part Number: C5240380; Supplier 1: LCSC; Category: Capacitors - MLCC; Supplier Part Number 1: C5240380; Voltage Rating: 10V; Temperature Coefficient: X5R; RoHS: Yes; ComponentLink1Description: Datasheet; ComponentLink1URL: https://wmsc.lcsc.com/wmsc/upload/file/pdf/v2/lcsc/2210281800_VIIYONG-V106M0603X5R100NKT_C5240380.pdf; ComponentLink2Description: JLCPCB Part URL; ComponentLink2URL: https://jlcpcb.com/partdetail/C5240380; ComponentLink3Description: LCSC Part URL; ComponentLink3URL: https://lcsc.com/product-detail/Multilayer-Ceramic-Capacitors-MLCC---SMD-SMT_VIIYONG-VIIYONG-V106M0603X5R100NKT_C5240380.html
footprint CAP-0603 (0603 (1608M) Capacitor)
pins: 1, 2
